# Altium footprint library SAMTEC SMD.PcbLib: 165 footprints (part 2 of 17) (continued)
## SAMTEC_CCH-J-04 [mm] "4 Positions CCH - Bull's Eye Low Cost High Performance SMA Test Point"
height 7.62
pads (36):
  round 0.66 hole 0.25: 1(-9.902,0) 3(-3.298,0) 5(3.298,0) 7(9.902,0)
  round 0.66 hole 0.4 mask-0.2: 2(-11.172,0) 2(-10.8,-0.898) 2(-10.8,0.898) 2(-9.902,1.27) 2(-9.004,-0.898) 2(-9.004,0.898) 2(-8.632,0) 4(-4.568,0) 4(-4.196,-0.898) 4(-4.196,0.898) 4(-3.298,1.27) 4(-2.4,-0.898) 4(-2.4,0.898) 4(-2.028,0) 6(2.028,0) 6(2.4,-0.898) 6(2.4,0.898) 6(3.298,1.27) 6(4.196,-0.898) 6(4.196,0.898) 6(4.568,0) 8(8.632,0) 8(9.004,-0.898) 8(9.004,0.898) 8(9.902,1.27) 8(10.8,-0.898) 8(10.8,0.898) 8(11.172,0)
  round 0.5 hole 1.7 unplated mask+0.6: 9(-6.6,2.159) 10(-6.6,-2.159) 11(6.6,-2.159) 12(6.6,2.159)
Top Layer:
  region: 7.362,-0.05 9.204,-0.05 9.203,0.046 9.242,0.233 9.329,0.403 9.46,0.542 9.623,0.642 9.807,0.693 9.998,0.693 10.181,0.642 10.344,0.542 10.475,0.403 10.562,0.233 10.601,0.046 10.6,-0.05 12.442,-0.05 12.446,0.203 12.356,0.702 12.169,1.173 11.893,1.597 11.538,1.959 11.119,2.244 10.652,2.44 10.155,2.54 9.649,2.54 9.152,2.44 8.685,2.244 8.266,1.959 7.911,1.597 7.635,1.173 7.448,0.702 7.358,0.203
  region: 7.362,0.05 7.358,-0.203 7.448,-0.702 7.635,-1.173 7.911,-1.597 8.266,-1.959 8.685,-2.244 9.152,-2.44 9.649,-2.54 10.155,-2.54 10.652,-2.44 11.119,-2.244 11.538,-1.959 11.893,-1.597 12.169,-1.173 12.356,-0.702 12.446,-0.203 12.442,0.05 10.6,0.05 10.601,-0.046 10.562,-0.233 10.475,-0.403 10.344,-0.542 10.181,-0.642 9.998,-0.693 9.807,-0.693 9.623,-0.642 9.46,-0.542 9.329,-0.403 9.242,-0.233 9.203,-0.046 9.204,0.05
  region: 0.762,-0.05 2.604,-0.05 2.603,0.046 2.642,0.233 2.729,0.403 2.86,0.542 3.023,0.642 3.207,0.693 3.398,0.693 3.581,0.642 3.744,0.542 3.875,0.403 3.962,0.233 4.001,0.046 4,-0.05 5.842,-0.05 5.846,0.203 5.756,0.702 5.569,1.173 5.293,1.597 4.938,1.959 4.519,2.244 4.052,2.44 3.555,2.54 3.049,2.54 2.552,2.44 2.085,2.244 1.666,1.959 1.311,1.597 1.035,1.173 0.848,0.702 0.758,0.203
  region: 0.762,0.05 0.758,-0.203 0.848,-0.702 1.035,-1.173 1.311,-1.597 1.666,-1.959 2.085,-2.244 2.552,-2.44 3.049,-2.54 3.555,-2.54 4.052,-2.44 4.519,-2.244 4.938,-1.959 5.293,-1.597 5.569,-1.173 5.756,-0.702 5.846,-0.203 5.842,0.05 4,0.05 4.001,-0.046 3.962,-0.233 3.875,-0.403 3.744,-0.542 3.581,-0.642 3.398,-0.693 3.207,-0.693 3.023,-0.642 2.86,-0.542 2.729,-0.403 2.642,-0.233 2.603,-0.046 2.604,0.05
  region: -5.842,-0.05 -4,-0.05 -4.001,0.046 -3.962,0.233 -3.875,0.403 -3.744,0.542 -3.581,0.642 -3.398,0.693 -3.207,0.693 -3.023,0.642 -2.86,0.542 -2.729,0.403 -2.642,0.233 -2.603,0.046 -2.604,-0.05 -0.762,-0.05 -0.758,0.203 -0.848,0.702 -1.035,1.173 -1.311,1.597 -1.666,1.959 -2.085,2.244 -2.552,2.44 -3.049,2.54 -3.555,2.54 -4.052,2.44 -4.519,2.244 -4.938,1.959 -5.293,1.597 -5.569,1.173 -5.756,0.702 -5.846,0.203
  region: -5.842,0.05 -5.846,-0.203 -5.756,-0.702 -5.569,-1.173 -5.293,-1.597 -4.938,-1.959 -4.519,-2.244 -4.052,-2.44 -3.555,-2.54 -3.049,-2.54 -2.552,-2.44 -2.085,-2.244 -1.666,-1.959 -1.311,-1.597 -1.035,-1.173 -0.848,-0.702 -0.758,-0.203 -0.762,0.05 -2.604,0.05 -2.603,-0.046 -2.642,-0.233 -2.729,-0.403 -2.86,-0.542 -3.023,-0.642 -3.207,-0.693 -3.398,-0.693 -3.581,-0.642 -3.744,-0.542 -3.875,-0.403 -3.962,-0.233 -4.001,-0.046 -4,0.05
  region: -12.446,-0.05 -10.604,-0.05 -10.605,0.046 -10.566,0.233 -10.479,0.403 -10.348,0.542 -10.185,0.642 -10.002,0.693 -9.811,0.693 -9.627,0.642 -9.464,0.542 -9.333,0.403 -9.246,0.233 -9.207,0.046 -9.208,-0.05 -7.366,-0.05 -7.362,0.203 -7.452,0.702 -7.639,1.173 -7.915,1.597 -8.27,1.959 -8.689,2.244 -9.156,2.44 -9.653,2.54 -10.159,2.54 -10.656,2.44 -11.123,2.244 -11.542,1.959 -11.897,1.597 -12.173,1.173 -12.36,0.702 -12.451,0.203
  region: -12.446,0.05 -12.451,-0.203 -12.36,-0.702 -12.173,-1.173 -11.897,-1.597 -11.542,-1.959 -11.123,-2.244 -10.656,-2.44 -10.159,-2.54 -9.653,-2.54 -9.156,-2.44 -8.689,-2.244 -8.27,-1.959 -7.915,-1.597 -7.639,-1.173 -7.452,-0.702 -7.362,-0.203 -7.366,0.05 -9.208,0.05 -9.207,-0.046 -9.246,-0.233 -9.333,-0.403 -9.464,-0.542 -9.627,-0.642 -9.811,-0.693 -10.002,-0.693 -10.185,-0.642 -10.348,-0.542 -10.479,-0.403 -10.566,-0.233 -10.605,-0.046 -10.604,0.05
Bottom Layer keep-out:
  circle w0.1: c-6.604,-2.159 r1.5
  circle w0.1: c-6.604,2.159 r1.5
  circle w0.1: c6.604,-2.159 r1.5
  circle w0.1: c6.604,2.159 r1.5
Top Overlay:
  lines w0.2: -9.906,-3.175 -8.505,-3.175 cw(c-8.505,-3.429) -8.294,-3.288 ccw(c-6.604,-2.159) -4.914,-3.288 cw(c-4.703,-3.429) -4.703,-3.175 4.703,-3.175 cw(c4.703,-3.429) 4.914,-3.288 ccw(c6.604,-2.159) 8.294,-3.288 cw(c8.505,-3.429) 8.505,-3.175 9.906,-3.175 ; -9.906,3.175 -8.505,3.175 ccw(c-8.505,3.429) -8.294,3.288 cw(c-6.604,2.159) -4.914,3.288 ccw(c-4.703,3.429) -4.703,3.175 4.703,3.175 ccw(c4.703,3.429) 4.914,3.288 cw(c6.604,2.159) 8.294,3.288 ccw(c8.505,3.429) 8.505,3.175 9.906,3.175 ; -7.859,-2.43 cw(c-9.902,0) -7.85,2.423 ; -5.336,-2.438 ccw(c-3.302,0) -0.34,-1.143 0.34,-1.143 ccw(c3.302,0) 5.296,-2.471 ; -5.306,2.462 cw(c-3.302,0) -0.34,1.143 0.34,1.143 cw(c3.302,0) 5.325,2.447 ; 7.85,-2.423 ccw(c9.902,0) 7.956,2.509
Bottom Solder:
  circle w0.33: c-10.8,-0.898 r0.165
  circle w0.33: c-11.172,0 r0.165
  circle w0.33: c-10.8,0.898 r0.165
  circle w0.33: c-9.902,1.27 r0.165
  circle w0.33: c-9.004,0.898 r0.165
  circle w0.33: c-8.632,0 r0.165
  circle w0.33: c-9.004,-0.898 r0.165
  circle w0.33: c-4.196,-0.898 r0.165
  circle w0.33: c-4.568,0 r0.165
  circle w0.33: c-4.196,0.898 r0.165
  circle w0.33: c-3.298,1.27 r0.165
  circle w0.33: c-2.4,0.898 r0.165
  circle w0.33: c-2.028,0 r0.165
  circle w0.33: c-2.4,-0.898 r0.165
  circle w0.33: c2.4,-0.898 r0.165
  circle w0.33: c2.028,0 r0.165
  circle w0.33: c2.4,0.898 r0.165
  circle w0.33: c3.298,1.27 r0.165
  circle w0.33: c4.196,0.898 r0.165
  circle w0.33: c4.568,0 r0.165
  circle w0.33: c9.004,-0.898 r0.165
  circle w0.33: c8.632,0 r0.165
  circle w0.33: c9.004,0.898 r0.165
  circle w0.33: c9.902,1.27 r0.165
  circle w0.33: c10.8,0.898 r0.165
  circle w0.33: c11.172,0 r0.165
  circle w0.33: c10.8,-0.898 r0.165
Mechanical 8:
  drawing of 224 lines, arcs and shapes, not listed
Mechanical 14:
  circle w0.1: c-6.604,-2.159 r0.679
  circle w0.1: c-6.604,2.159 r0.679
  circle w0.1: c-3.302,0 r1.651
  circle w0.1: c-3.302,0 r1.378
  circle w0.1: c-9.906,0 r1.651
  circle w0.1: c-9.906,0 r1.378
  circle w0.1: c6.604,-2.159 r0.679
  circle w0.1: c6.604,2.159 r0.679
  circle w0.1: c9.906,0 r1.651
  circle w0.1: c9.906,0 r1.378
  circle w0.1: c3.302,0 r1.651
  circle w0.1: c3.302,0 r1.378
  lines w0.1: -10.829,-3.038 ccw(c-9.906,0) -8.983,-3.038 ; -10.829,3.038 cw(c-9.906,0) -8.983,3.038 ; -9.906,-3.175 -8.505,-3.175 cw(c-8.505,-3.429) -8.294,-3.288 ccw(c-6.604,-2.159) -4.914,-3.288 cw(c-4.703,-3.429) -4.703,-3.175 4.703,-3.175 cw(c4.703,-3.429) 4.914,-3.288 ccw(c6.604,-2.159) 8.294,-3.288 cw(c8.505,-3.429) 8.505,-3.175 9.906,-3.175 ; -9.906,3.175 -8.505,3.175 ccw(c-8.505,3.429) -8.294,3.288 cw(c-6.604,2.159) -4.914,3.288 ccw(c-4.703,3.429) -4.703,3.175 4.703,3.175 ccw(c4.703,3.429) 4.914,3.288 cw(c6.604,2.159) 8.294,3.288 ccw(c8.505,3.429) 8.505,3.175 9.906,3.175 ; -4.225,-3.038 ccw(c-3.302,0) -2.379,-3.038 ; -4.225,3.038 cw(c-3.302,0) -2.379,3.038 ; 2.379,-3.038 ccw(c3.302,0) 4.225,-3.038 ; 2.379,3.038 cw(c3.302,0) 4.225,3.038 ; 8.983,-3.038 ccw(c9.906,0) 10.829,-3.038 ; 8.983,3.038 cw(c9.906,0) 10.829,3.038 ; -6.944,-1.143 cw(c-9.906,0) -6.944,1.143 -6.264,1.143 cw(c-3.302,0) -0.34,1.143 0.34,1.143 cw(c3.302,0) 6.264,1.143 6.944,1.143 cw(c9.906,0) 6.944,-1.143 6.264,-1.143 cw(c3.302,0) 0.34,-1.143 -0.34,-1.143 cw(c-3.302,0) -6.264,-1.143 -6.944,-1.143
Mechanical 15:
  lines w0.05: -8.505,-3.425 -9.906,-3.425 cw(c-9.906,0) -9.906,3.425 -8.505,3.425 ; -8.501,-3.427 ccw(c-6.604,-2.159) -4.707,-3.427 ; -8.501,3.427 cw(c-6.604,2.159) -4.707,3.427 ; -4.703,-3.425 4.703,-3.425 ; -4.703,3.425 4.703,3.425 ; 4.707,-3.427 ccw(c6.604,-2.159) 8.501,-3.427 ; 4.707,3.427 cw(c6.604,2.159) 8.501,3.427 ; 8.505,-3.425 9.906,-3.425 ccw(c9.906,0) 9.906,3.425 8.505,3.425
Drill Drawing:
  lines w0.1: -7.8,2.9 -9.9,2.9 -9.9,0.8 ; -3.296,2.9 -3.296,0.8 ; 3.3,2.9 3.3,0.8 ; 7.804,2.9 9.904,2.9 9.904,0.8 ; -9.9,0.8 -10.05,0.95 -9.75,0.95 -9.9,0.8 ; -3.296,0.8 -3.446,0.95 -3.146,0.95 -3.296,0.8 ; 3.3,0.8 3.15,0.95 3.45,0.95 3.3,0.8 ; 9.904,0.8 9.754,0.95 10.054,0.95 9.904,0.8
  text "4 Filled holes" at -6.5,3.3 h1
3D body "SAMTEC_CCH-J-04_Part2.stp": height 3.16, standoff -2.62, extent -7.999,-3.55 7.999,3.554
3D body "SAMTEC_CCH-J-04_Part1.stp": height 7.62, standoff 0, extent -13.081,-4.171 13.081,4.171

## SAMTEC_CCH-J-04_old [mm] "4 Positions CCH - Bull's Eye Low Cost High Performance SMA Test Point"
height 7.62
pads (36):
  round 0.66 hole 0.25: 1(-9.902,0) 3(-3.298,0) 5(3.298,0) 7(9.902,0)
  round 0.66 hole 0.4: 2(-11.172,0) 2(-10.8,-0.898) 2(-10.8,0.898) 2(-9.902,1.27) 2(-9.004,-0.898) 2(-9.004,0.898) 2(-8.632,0) 4(-4.568,0) 4(-4.196,-0.898) 4(-4.196,0.898) 4(-3.298,1.27) 4(-2.4,-0.898) 4(-2.4,0.898) 4(-2.028,0) 6(2.028,0) 6(2.4,-0.898) 6(2.4,0.898) 6(3.298,1.27) 6(4.196,-0.898) 6(4.196,0.898) 6(4.568,0) 8(8.632,0) 8(9.004,-0.898) 8(9.004,0.898) 8(9.902,1.27) 8(10.8,-0.898) 8(10.8,0.898) 8(11.172,0)
  round 0.5 hole 1.7 unplated mask+0.6: 9(-6.6,2.159) 10(-6.6,-2.159) 11(6.6,-2.159) 12(6.6,2.159)
Top Layer:
  circle w1.84: c9.902,0 r1.62
  circle w1.84: c3.298,0 r1.62
  circle w1.84: c-3.298,0 r1.62
  circle w1.84: c-9.902,0 r1.62
Bottom Layer keep-out:
  circle w0.1: c-6.604,-2.159 r1.5
  circle w0.1: c-6.604,2.159 r1.5
  circle w0.1: c6.604,-2.159 r1.5
  circle w0.1: c6.604,2.159 r1.5
Top Overlay:
  lines w0.2: -10.829,-3.038 ccw(c-9.906,0) -8.983,-3.038 ; -10.829,3.038 cw(c-9.906,0) -8.983,3.038 ; -9.906,-3.175 -8.505,-3.175 cw(c-8.505,-3.429) -8.294,-3.288 ccw(c-6.604,-2.159) -4.914,-3.288 cw(c-4.703,-3.429) -4.703,-3.175 4.703,-3.175 cw(c4.703,-3.429) 4.914,-3.288 ccw(c6.604,-2.159) 8.294,-3.288 cw(c8.505,-3.429) 8.505,-3.175 9.906,-3.175 ; -9.906,3.175 -8.505,3.175 ccw(c-8.505,3.429) -8.294,3.288 cw(c-6.604,2.159) -4.914,3.288 ccw(c-4.703,3.429) -4.703,3.175 4.703,3.175 ccw(c4.703,3.429) 4.914,3.288 cw(c6.604,2.159) 8.294,3.288 ccw(c8.505,3.429) 8.505,3.175 9.906,3.175 ; -7.678,-2.262 cw(c-9.906,0) -7.678,2.262 ; -5.53,-2.262 ccw(c-3.302,0) -0.34,-1.143 0.34,-1.143 ccw(c3.302,0) 5.53,-2.262 ; -5.53,2.262 cw(c-3.302,0) -0.34,1.143 0.34,1.143 cw(c3.302,0) 5.53,2.262 ; -4.225,-3.038 ccw(c-3.302,0) -2.379,-3.038 ; -4.225,3.038 cw(c-3.302,0) -2.379,3.038 ; 2.379,-3.038 ccw(c3.302,0) 4.225,-3.038 ; 2.379,3.038 cw(c3.302,0) 4.225,3.038 ; 7.678,-2.262 ccw(c9.906,0) 7.678,2.262 ; 8.983,-3.038 ccw(c9.906,0) 10.829,-3.038 ; 8.983,3.038 cw(c9.906,0) 10.829,3.038
Mechanical 8:
  drawing of 224 lines, arcs and shapes, not listed
Mechanical 14:
  circle w0.1: c-6.604,-2.159 r0.679
  circle w0.1: c-6.604,2.159 r0.679
  circle w0.1: c-3.302,0 r1.651
  circle w0.1: c-3.302,0 r1.378
  circle w0.1: c-9.906,0 r1.651
  circle w0.1: c-9.906,0 r1.378
  circle w0.1: c6.604,-2.159 r0.679
  circle w0.1: c6.604,2.159 r0.679
  circle w0.1: c9.906,0 r1.651
  circle w0.1: c9.906,0 r1.378
  circle w0.1: c3.302,0 r1.651
  circle w0.1: c3.302,0 r1.378
  lines w0.1: -10.829,-3.038 ccw(c-9.906,0) -8.983,-3.038 ; -10.829,3.038 cw(c-9.906,0) -8.983,3.038 ; -9.906,-3.175 -8.505,-3.175 cw(c-8.505,-3.429) -8.294,-3.288 ccw(c-6.604,-2.159) -4.914,-3.288 cw(c-4.703,-3.429) -4.703,-3.175 4.703,-3.175 cw(c4.703,-3.429) 4.914,-3.288 ccw(c6.604,-2.159) 8.294,-3.288 cw(c8.505,-3.429) 8.505,-3.175 9.906,-3.175 ; -9.906,3.175 -8.505,3.175 ccw(c-8.505,3.429) -8.294,3.288 cw(c-6.604,2.159) -4.914,3.288 ccw(c-4.703,3.429) -4.703,3.175 4.703,3.175 ccw(c4.703,3.429) 4.914,3.288 cw(c6.604,2.159) 8.294,3.288 ccw(c8.505,3.429) 8.505,3.175 9.906,3.175 ; -4.225,-3.038 ccw(c-3.302,0) -2.379,-3.038 ; -4.225,3.038 cw(c-3.302,0) -2.379,3.038 ; 2.379,-3.038 ccw(c3.302,0) 4.225,-3.038 ; 2.379,3.038 cw(c3.302,0) 4.225,3.038 ; 8.983,-3.038 ccw(c9.906,0) 10.829,-3.038 ; 8.983,3.038 cw(c9.906,0) 10.829,3.038 ; -6.944,-1.143 cw(c-9.906,0) -6.944,1.143 -6.264,1.143 cw(c-3.302,0) -0.34,1.143 0.34,1.143 cw(c3.302,0) 6.264,1.143 6.944,1.143 cw(c9.906,0) 6.944,-1.143 6.264,-1.143 cw(c3.302,0) 0.34,-1.143 -0.34,-1.143 cw(c-3.302,0) -6.264,-1.143 -6.944,-1.143
Mechanical 15:
  lines w0.05: -8.505,-3.425 -9.906,-3.425 cw(c-9.906,0) -9.906,3.425 -8.505,3.425 ; -8.501,-3.427 ccw(c-6.604,-2.159) -4.707,-3.427 ; -8.501,3.427 cw(c-6.604,2.159) -4.707,3.427 ; -4.703,-3.425 4.703,-3.425 ; -4.703,3.425 4.703,3.425 ; 4.707,-3.427 ccw(c6.604,-2.159) 8.501,-3.427 ; 4.707,3.427 cw(c6.604,2.159) 8.501,3.427 ; 8.505,-3.425 9.906,-3.425 ccw(c9.906,0) 9.906,3.425 8.505,3.425
Drill Drawing:
  lines w0.1: -7.8,2.9 -9.9,2.9 -9.9,0.8 ; -3.296,2.9 -3.296,0.8 ; 3.3,2.9 3.3,0.8 ; 7.804,2.9 9.904,2.9 9.904,0.8 ; -9.9,0.8 -10.05,0.95 -9.75,0.95 -9.9,0.8 ; -3.296,0.8 -3.446,0.95 -3.146,0.95 -3.296,0.8 ; 3.3,0.8 3.15,0.95 3.45,0.95 3.3,0.8 ; 9.904,0.8 9.754,0.95 10.054,0.95 9.904,0.8
  text "4 Filled holes" at -6.5,3.3 h1
3D body "SAMTEC_CCH-J-04_Part2.stp": height 3.16, standoff -2.62, extent -7.999,-3.55 7.999,3.554
3D body "SAMTEC_CCH-J-04_Part1.stp": height 7.62, standoff 0, extent -13.081,-4.171 13.081,4.171

## SAMTEC_CLE-110-01-G-DV-A-K [mm] "20 Contacts - Pitch 0.8mm - Dual Row Surface Mount Straight Strip Socket With Alignment Pin and Polyimide film Pick & Place Pad"
height 3.3
pads (22):
  rect 0.508x1.37 smd: 1(-3.6,1.98) 2(-3.6,-1.98) 3(-2.8,1.98) 4(-2.8,-1.98) 5(-2,1.98) 6(-2,-1.98) 7(-1.2,1.98) 8(-1.2,-1.98) 9(-0.4,1.98) 10(-0.4,-1.98) 11(0.4,1.98) 12(0.4,-1.98) 13(1.2,1.98) 14(1.2,-1.98) 15(2,1.98) 16(2,-1.98) 17(2.8,1.98) 18(2.8,-1.98) 19(3.6,1.98) 20(3.6,-1.98)
  round 0.5 hole 0.7 unplated mask+0.1: POS1(-3.2,0) POS2(3.2,0)
Top Overlay:
  circle w0.2: c-3.2,0 r0.152
  circle w0.2: c-2.4,0 r0.152
  circle w0.2: c-1.6,0 r0.152
  circle w0.2: c-0.8,0 r0.152
  circle w0.2: c0,0 r0.152
  circle w0.2: c0.8,0 r0.152
  circle w0.2: c1.6,0 r0.152
  circle w0.2: c2.4,0 r0.152
  circle w0.2: c3.2,0 r0.152
  circle w0.25: c-3.602,3.236 r0.125
  lines w0.2: -4.204,-1.587 -4.204,1.587 ; 4.204,-1.587 4.204,1.587
Mechanical 8:
  drawing of 234 lines, arcs and shapes, not listed
Mechanical 14:
  drawing of 254 lines, arcs and shapes, not listed
Mechanical 15:
  lines w0.05: -4.314,-2.915 -4.314,2.915 4.314,2.915 4.314,-2.915 -4.314,-2.915
3D body "SAMTEC_CLE-110-01-G-DV-A-K.stp": height 3.3, standoff -0.71, extent -4.064,-2.413 4.064,2.413

## SAMTEC_CLM-107-02-L-D-PA-TR [mm] "14 Contacts - Pitch 1mm - Dual Row Surface Mount Straight Strip Header With Integral Alignment Pin"
height 2.26
pads (16):
  rect 0.61x1.37 smd: 1(-3,1.6) 2(-3,-1.6) 3(-2,1.6) 4(-2,-1.6) 5(-1,1.6) 6(-1,-1.6) 7(0,1.6) 8(0,-1.6) 9(1,1.6) 10(1,-1.6) 11(2,1.6) 12(2,-1.6) 13(3,1.6) 14(3,-1.6)
  round 0.5 hole 1 unplated mask+0.25: POS1(0,3.495) POS2(0,-3.495)
Top Layer keep-out:
  circle w0.1: c0,3.495 r0.75
  circle w0.1: c0,-3.495 r0.75
Top Overlay:
  circle w0.25: c-2.952,2.985 r0.125
  circle w0.25: c-2.952,2.985 r0.125
  lines w0.1: -3.659,-1.27 -3.659,1.27 ; 3.659,-1.27 3.659,1.27
Mechanical 8:
  circle w0.1: c0,-3.495 r0.5
  circle w0.1: c0,3.495 r0.5
  lines w0.1: -3.5,-1.6 -3,-1.6 ; -3.5,1.6 -3,1.6 ; -3,-2.1 -3,-1.6 ; -3,-1.1 -3,-1.6 ; -3,1.1 -3,1.6 ; -3,2.1 -3,1.6 ; -2.5,-1.6 -2,-1.6 ; -2.5,1.6 -2,1.6 ; -2,-2.1 -2,-1.6 ; -2,-1.1 -2,-1.6 ; -2,1.1 -2,1.6 ; -2,2.1 -2,1.6 ; -1.5,-1.6 -1,-1.6 ; -1.5,1.6 -1,1.6 ; -1,-2.1 -1,-1.6 ; -1,-1.1 -1,-1.6 ; -1,1.1 -1,1.6 ; -1,2.1 -1,1.6 ; -0.5,-3.495 0,-3.495 ; -0.5,-1.6 0,-1.6 ; -0.5,0 0,0 ; -0.5,1.6 0,1.6 ; -0.5,3.495 0,3.495 ; 0,-3.995 0,-3.495 ; 0,-2.995 0,-3.495 ; 0,-2.1 0,-1.6 ; 0,-1.1 0,-1.6 ; 0,-0.5 0,0 ; 0,0.5 0,0 ; 0,1.1 0,1.6 ; 0,2.1 0,1.6 ; 0,2.995 0,3.495 ; 0,3.995 0,3.495 ; 0.5,-3.495 0,-3.495 ; 0.5,-1.6 1,-1.6 ; 0.5,0 0,0 ; 0.5,1.6 1,1.6 ; 0.5,3.495 0,3.495 ; 1,-2.1 1,-1.6 ; 1,-1.1 1,-1.6 ; 1,1.1 1,1.6 ; 1,2.1 1,1.6 ; 1.5,-1.6 2,-1.6 ; 1.5,1.6 2,1.6 ; 2,-2.1 2,-1.6 ; 2,-1.1 2,-1.6 ; 2,1.1 2,1.6 ; 2,2.1 2,1.6 ; 2.5,-1.6 3,-1.6 ; 2.5,1.6 3,1.6 ; 3,-2.1 3,-1.6 ; 3,-1.1 3,-1.6 ; 3,1.1 3,1.6 ; 3,2.1 3,1.6 ; -3.305,-2.285 -3.305,-0.915 -2.695,-0.915 -2.695,-2.285 -3.305,-2.285 ; -3.305,0.915 -3.305,2.285 -2.695,2.285 -2.695,0.915 -3.305,0.915 ; -2.305,-2.285 -2.305,-0.915 -1.695,-0.915 -1.695,-2.285 -2.305,-2.285 ; -2.305,0.915 -2.305,2.285 -1.695,2.285 -1.695,0.915 -2.305,0.915 ; -1.305,-2.285 -1.305,-0.915 -0.695,-0.915 -0.695,-2.285 -1.305,-2.285 ; -1.305,0.915 -1.305,2.285 -0.695,2.285 -0.695,0.915 -1.305,0.915 ; -0.305,-2.285 -0.305,-0.915 0.305,-0.915 0.305,-2.285 -0.305,-2.285 ; -0.305,0.915 -0.305,2.285 0.305,2.285 0.305,0.915 -0.305,0.915 ; 0.695,-2.285 0.695,-0.915 1.305,-0.915 1.305,-2.285 0.695,-2.285 ; 0.695,0.915 0.695,2.285 1.305,2.285 1.305,0.915 0.695,0.915 ; 1.695,-2.285 1.695,-0.915 2.305,-0.915 2.305,-2.285 1.695,-2.285 ; 1.695,0.915 1.695,2.285 2.305,2.285 2.305,0.915 1.695,0.915 ; 2.695,-2.285 2.695,-0.915 3.305,-0.915 3.305,-2.285 2.695,-2.285 ; 2.695,0.915 2.695,2.285 3.305,2.285 3.305,0.915 2.695,0.915
Mechanical 14:
  drawing of 217 lines, arcs and shapes, not listed
Mechanical 15:
  lines w0.1: -3.909,-2.535 -3.909,2.535 -2.028,2.535 -2.028,4.378 2.028,4.378 2.028,2.535 3.909,2.535 3.909,-2.535 2.028,-2.535 2.028,-4.378 -2.028,-4.378 -2.028,-2.535 -3.909,-2.535
3D body "SAMTEC_CLM-107-02-L-D-PA-TR_Part2.stp": height 3.01, standoff -1.36, extent -1.778,-4.127 1.778,4.128
3D body "SAMTEC_CLM-107-02-L-D-PA-TR_Part1.stp": height 2.25, standoff 0, extent -3.659,-1.905 3.659,1.905

## SAMTEC_CLP-106-02-L-D-A [mm] "20 Contacts - Pitch 1.27mm - Low Profile Dual Wipe Socket"
height 2.29
pads (14):
  rect 0.74x1.47 smd: 1(-3.175,1.615) 2(-3.175,-1.615) 3(-1.905,1.615) 4(-1.905,-1.615) 5(-0.635,1.615) 6(-0.635,-1.615) 7(0.635,1.615) 8(0.635,-1.615) 9(1.905,1.615) 10(1.905,-1.615) 11(3.175,1.615) 12(3.175,-1.615)
  round 0.5 hole 0.75 unplated mask+0.125: 13(-2.54,0) 13(2.54,0)
Top Overlay:
  circle w0.25: c-4.316,2.032 r0.125
  circle w0.25: c-4.316,2.032 r0.125
  lines w0.2: -3.896,1.524 -4.026,1.524 -4.026,-1.524 -3.895,-1.524 ; 3.895,-1.524 4.026,-1.524 4.026,1.524 3.896,1.524
Mechanical 8:
  circle w0.05: c-2.54,0 r0.37
  circle w0.05: c2.54,0 r0.37
  lines w0.05: -3.675,-1.615 -3.175,-1.615 ; -3.675,1.615 -3.175,1.615 ; -3.175,-2.115 -3.175,-1.615 ; -3.175,-1.115 -3.175,-1.615 ; -3.175,1.115 -3.175,1.615 ; -3.175,2.115 -3.175,1.615 ; -3.04,0 -2.54,0 ; -2.675,-1.615 -3.175,-1.615 ; -2.675,1.615 -3.175,1.615 ; -2.54,-0.5 -2.54,0 ; -2.54,0.5 -2.54,0 ; -2.405,-1.615 -1.905,-1.615 ; -2.405,1.615 -1.905,1.615 ; -2.04,0 -2.54,0 ; -1.905,-2.115 -1.905,-1.615 ; -1.905,-1.115 -1.905,-1.615 ; -1.905,1.115 -1.905,1.615 ; -1.905,2.115 -1.905,1.615 ; -1.405,-1.615 -1.905,-1.615 ; -1.405,1.615 -1.905,1.615 ; -1.135,-1.615 -0.635,-1.615 ; -1.135,1.615 -0.635,1.615 ; -0.635,-2.115 -0.635,-1.615 ; -0.635,-1.115 -0.635,-1.615 ; -0.635,1.115 -0.635,1.615 ; -0.635,2.115 -0.635,1.615 ; -0.5,0 0,0 ; -0.135,-1.615 -0.635,-1.615 ; -0.135,1.615 -0.635,1.615 ; 0,-0.5 0,0 ; 0,0.5 0,0 ; 0.135,-1.615 0.635,-1.615 ; 0.135,1.615 0.635,1.615 ; 0.5,0 0,0 ; 0.635,-2.115 0.635,-1.615 ; 0.635,-1.115 0.635,-1.615 ; 0.635,1.115 0.635,1.615 ; 0.635,2.115 0.635,1.615 ; 1.135,-1.615 0.635,-1.615 ; 1.135,1.615 0.635,1.615 ; 1.405,-1.615 1.905,-1.615 ; 1.405,1.615 1.905,1.615 ; 1.905,-2.115 1.905,-1.615 ; 1.905,-1.115 1.905,-1.615 ; 1.905,1.115 1.905,1.615 ; 1.905,2.115 1.905,1.615 ; 2.04,0 2.54,0 ; 2.405,-1.615 1.905,-1.615 ; 2.405,1.615 1.905,1.615 ; 2.54,-0.5 2.54,0 ; 2.54,0.5 2.54,0 ; 2.675,-1.615 3.175,-1.615 ; 2.675,1.615 3.175,1.615 ; 3.04,0 2.54,0 ; 3.175,-2.115 3.175,-1.615 ; 3.175,-1.115 3.175,-1.615 ; 3.175,1.115 3.175,1.615 ; 3.175,2.115 3.175,1.615 ; 3.675,-1.615 3.175,-1.615 ; 3.675,1.615 3.175,1.615 ; -3.545,-2.35 -3.545,-0.88 -2.805,-0.88 -2.805,-2.35 -3.545,-2.35 ; -3.545,0.88 -2.805,0.88 -2.805,2.35 -3.545,2.35 -3.545,0.88 ; -2.275,-2.35 -2.275,-0.88 -1.535,-0.88 -1.535,-2.35 -2.275,-2.35 ; -2.275,0.88 -1.535,0.88 -1.535,2.35 -2.275,2.35 -2.275,0.88 ; -1.005,-2.35 -1.005,-0.88 -0.265,-0.88 -0.265,-2.35 -1.005,-2.35 ; -1.005,0.88 -0.265,0.88 -0.265,2.35 -1.005,2.35 -1.005,0.88 ; 0.265,-2.35 0.265,-0.88 1.005,-0.88 1.005,-2.35 0.265,-2.35 ; 0.265,0.88 0.265,2.35 1.005,2.35 1.005,0.88 0.265,0.88 ; 1.535,-2.35 1.535,-0.88 2.275,-0.88 2.275,-2.35 1.535,-2.35 ; 1.535,0.88 1.535,2.35 2.275,2.35 2.275,0.88 1.535,0.88 ; 2.805,-2.35 2.805,-0.88 3.545,-0.88 3.545,-2.35 2.805,-2.35 ; 2.805,0.88 2.805,2.35 3.545,2.35 3.545,0.88 2.805,0.88
Mechanical 14:
  drawing of 185 lines, arcs and shapes, not listed
Mechanical 15:
  lines w0.05: -4.276,-2.6 4.276,-2.6 4.276,2.6 -4.276,2.6 -4.276,-2.6
3D body "SAMTEC_CLP-106-02-L-D-A.stp": height 2.25, standoff -0.51, extent -4.026,-2.159 4.026,2.159

## SAMTEC_CLP-111-02-L-D-BE-K [mm] "22 Contacts - Pitch 1.27mm - Low Profile Dual Wipe Socket"
height 2.29
pads (44):
  rect 0.74x1.47 smd: 1(-6.35,1.87) 2(-6.35,-1.87) 3(-5.08,1.87) 4(-5.08,-1.87) 5(-3.81,1.87) 6(-3.81,-1.87) 7(-2.54,1.87) 8(-2.54,-1.87) 9(-1.27,1.87) 10(-1.27,-1.87) 11(0,1.87) 12(0,-1.87) 13(1.27,1.87) 14(1.27,-1.87) 15(2.54,1.87) 16(2.54,-1.87) 17(3.81,1.87) 18(3.81,-1.87) 19(5.08,1.87) 20(5.08,-1.87) 21(6.35,1.87) 22(6.35,-1.87)
  round 0.5 hole 0.8 unplated mask+0.15: 23(-6.35,-0.635) 23(-6.35,0.635) 23(-5.08,-0.635) 23(-5.08,0.635) 23(-3.81,-0.635) 23(-3.81,0.635) 23(-2.54,-0.635) 23(-2.54,0.635) 23(-1.27,-0.635) 23(-1.27,0.635) 23(0,-0.635) 23(0,0.635) 23(1.27,-0.635) 23(1.27,0.635) 23(2.54,-0.635) 23(2.54,0.635) 23(3.81,-0.635) 23(3.81,0.635) 23(5.08,-0.635) 23(5.08,0.635) 23(6.35,-0.635) 23(6.35,0.635)
Top Overlay:
  circle w0.25: c-7.593,2.235 r0.125
  circle w0.25: c-7.593,2.235 r0.125
  lines w0.2: -7.07,-1.524 -7.201,-1.524 -7.201,1.524 -7.07,1.524 ; 7.07,-1.524 7.201,-1.524 7.201,1.524 7.07,1.524
Mechanical 8:
  drawing of 290 lines, arcs and shapes, not listed
Mechanical 14:
  drawing of 159 lines, arcs and shapes, not listed
Mechanical 15:
  lines w0.05: -7.451,-2.855 7.451,-2.855 7.451,2.855 -7.451,2.855 -7.451,-2.855
3D body "SAMTEC_CLP-111-02-L-D-BE-K.stp": height 2.29, standoff 0, extent -7.201,-2.159 7.201,2.159

## SAMTEC_ERF5-030-05.0-L-DV-K [mm] "60 Contacts, Pitch 0.5mm, Edge Rate™ Rugged High Speed Straight Socket Strip"
height 4.91
pads (62):
  rect 0.3x1 smd: 1(7.25,2.225) 2(7.25,-2.225) 3(6.75,2.225) 4(6.75,-2.225) 5(6.25,2.225) 6(6.25,-2.225) 7(5.75,2.225) 8(5.75,-2.225) 9(5.25,2.225) 10(5.25,-2.225) 11(4.75,2.225) 12(4.75,-2.225) 13(4.25,2.225) 14(4.25,-2.225) 15(3.75,2.225) 16(3.75,-2.225) 17(3.25,2.225) 18(3.25,-2.225) 19(2.75,2.225) 20(2.75,-2.225) 21(2.25,2.225) 22(2.25,-2.225) 23(1.75,2.225) 24(1.75,-2.225) 25(1.25,2.225) 26(1.25,-2.225) 27(0.75,2.225) 28(0.75,-2.225) 29(0.25,2.225) 30(0.25,-2.225) 31(-0.25,2.225) 32(-0.25,-2.225) 33(-0.75,2.225) 34(-0.75,-2.225) 35(-1.25,2.225) 36(-1.25,-2.225) 37(-1.75,2.225) 38(-1.75,-2.225) 39(-2.25,2.225) 40(-2.25,-2.225) 41(-2.75,2.225) 42(-2.75,-2.225) 43(-3.25,2.225) 44(-3.25,-2.225) 45(-3.75,2.225) 46(-3.75,-2.225) 47(-4.25,2.225) 48(-4.25,-2.225) 49(-4.75,2.225) 50(-4.75,-2.225) 51(-5.25,2.225) 52(-5.25,-2.225) 53(-5.75,2.225) 54(-5.75,-2.225) 55(-6.25,2.225) 56(-6.25,-2.225) 57(-6.75,2.225) 58(-6.75,-2.225) 59(-7.25,2.225) 60(-7.25,-2.225)
  round 0.5 hole 1.45 unplated mask+0.475: 61(-9.4,1.4) 62(9.4,1.4)
Top Overlay:
  lines w0.1: -10.06,-0.2 -9.66,-0.2 -9.66,0.2 -10.06,0.2 ; -10.06,0.3 -10.06,-1.405 -7.71,-1.405 -7.71,1.405 -8.3,1.405 ; -7.325,-0.945 -7.175,-0.945 ; -7.325,0.945 -7.175,0.945 ; -6.825,-0.945 -6.675,-0.945 ; -6.825,0.945 -6.675,0.945 ; -6.325,-0.945 -6.175,-0.945 ; -6.325,0.945 -6.175,0.945 ; -5.825,-0.945 -5.675,-0.945 ; -5.825,0.945 -5.675,0.945 ; -5.325,-0.945 -5.175,-0.945 ; -5.325,0.945 -5.175,0.945 ; -4.825,-0.945 -4.675,-0.945 ; -4.825,0.945 -4.675,0.945 ; -4.325,-0.945 -4.175,-0.945 ; -4.325,0.945 -4.175,0.945 ; -3.825,-0.945 -3.675,-0.945 ; -3.825,0.945 -3.675,0.945 ; -3.325,-0.945 -3.175,-0.945 ; -3.325,0.945 -3.175,0.945 ; -2.825,-0.945 -2.675,-0.945 ; -2.825,0.945 -2.675,0.945 ; -2.325,-0.945 -2.175,-0.945 ; -2.325,0.945 -2.175,0.945 ; -1.825,-0.945 -1.675,-0.945 ; -1.825,0.945 -1.675,0.945 ; -1.325,-0.945 -1.175,-0.945 ; -1.325,0.945 -1.175,0.945 ; -0.825,-0.945 -0.675,-0.945 ; -0.825,0.945 -0.675,0.945 ; -0.325,-0.945 -0.175,-0.945 ; -0.325,0.945 -0.175,0.945 ; 0.175,-0.945 0.325,-0.945 ; 0.175,0.945 0.325,0.945 ; 0.675,-0.945 0.825,-0.945 ; 0.675,0.945 0.825,0.945 ; 1.175,-0.945 1.325,-0.945 ; 1.175,0.945 1.325,0.945 ; 1.675,-0.945 1.825,-0.945 ; 1.675,0.945 1.825,0.945 ; 2.175,-0.945 2.325,-0.945 ; 2.175,0.945 2.325,0.945 ; 2.675,-0.945 2.825,-0.945 ; 2.675,0.945 2.825,0.945 ; 3.175,-0.945 3.325,-0.945 ; 3.175,0.945 3.325,0.945 ; 3.675,-0.945 3.825,-0.945 ; 3.675,0.945 3.825,0.945 ; 4.175,-0.945 4.325,-0.945 ; 4.175,0.945 4.325,0.945 ; 4.675,-0.945 4.825,-0.945 ; 4.675,0.945 4.825,0.945 ; 5.175,-0.945 5.325,-0.945 ; 5.175,0.945 5.325,0.945 ; 5.675,-0.945 5.825,-0.945 ; 5.675,0.945 5.825,0.945 ; 6.175,-0.945 6.325,-0.945 ; 6.175,0.945 6.325,0.945 ; 6.675,-0.945 6.825,-0.945 ; 6.675,0.945 6.825,0.945 ; 7.175,-0.945 7.325,-0.945 ; 7.175,0.945 7.325,0.945 ; 8.3,1.405 7.71,1.405 7.71,-1.405 9.56,-1.405 10.06,-0.905 10.06,0.3
  lines w0.2: -7.75,-2.475 -10.9,-2.475 -10.9,2.475 -7.75,2.475 ; 7.75,-2.475 10.9,-2.475 10.9,1.225 9.65,2.475 7.75,2.475
  text "1" at 7.137,3.302 h1
  text "2" at 7.02,-4.298 h1
  text "59" at -8.352,3.3 h1
  text "60" at -8.316,-4.3 h1
Mechanical 8:
  drawing of 374 lines, arcs and shapes, not listed
Mechanical 14:
  drawing of 502 lines, arcs and shapes, not listed
  text "60" at -8.316,-4.3 h1
  text "59" at -8.352,3.3 h1
  text "2" at 7.02,-4.298 h1
  text "1" at 7.137,3.302 h1
Mechanical 15:
  lines w0.05: -11.15,-2.975 -11.15,2.975 11.15,2.975 11.15,-2.975 -11.15,-2.975
3D body "SAMTEC_ERF5-030-05.0-L-DV-K.stp": height 4.91, standoff -1.09, extent -10.9,-2.475 10.9,2.475